# Altium footprint library Connectors.PcbLib: 268 footprints (part 18 of 21)
Each footprint in its own frame and in the unit in brackets; x right, y up, seen from the top. Pads: shape width x height; smd on the part's side, far side on the other; paste and mask are expansions set on the pad; w line width, h text height; cw(c..) or ccw(c..) is an arc to the next point about the centre after c.
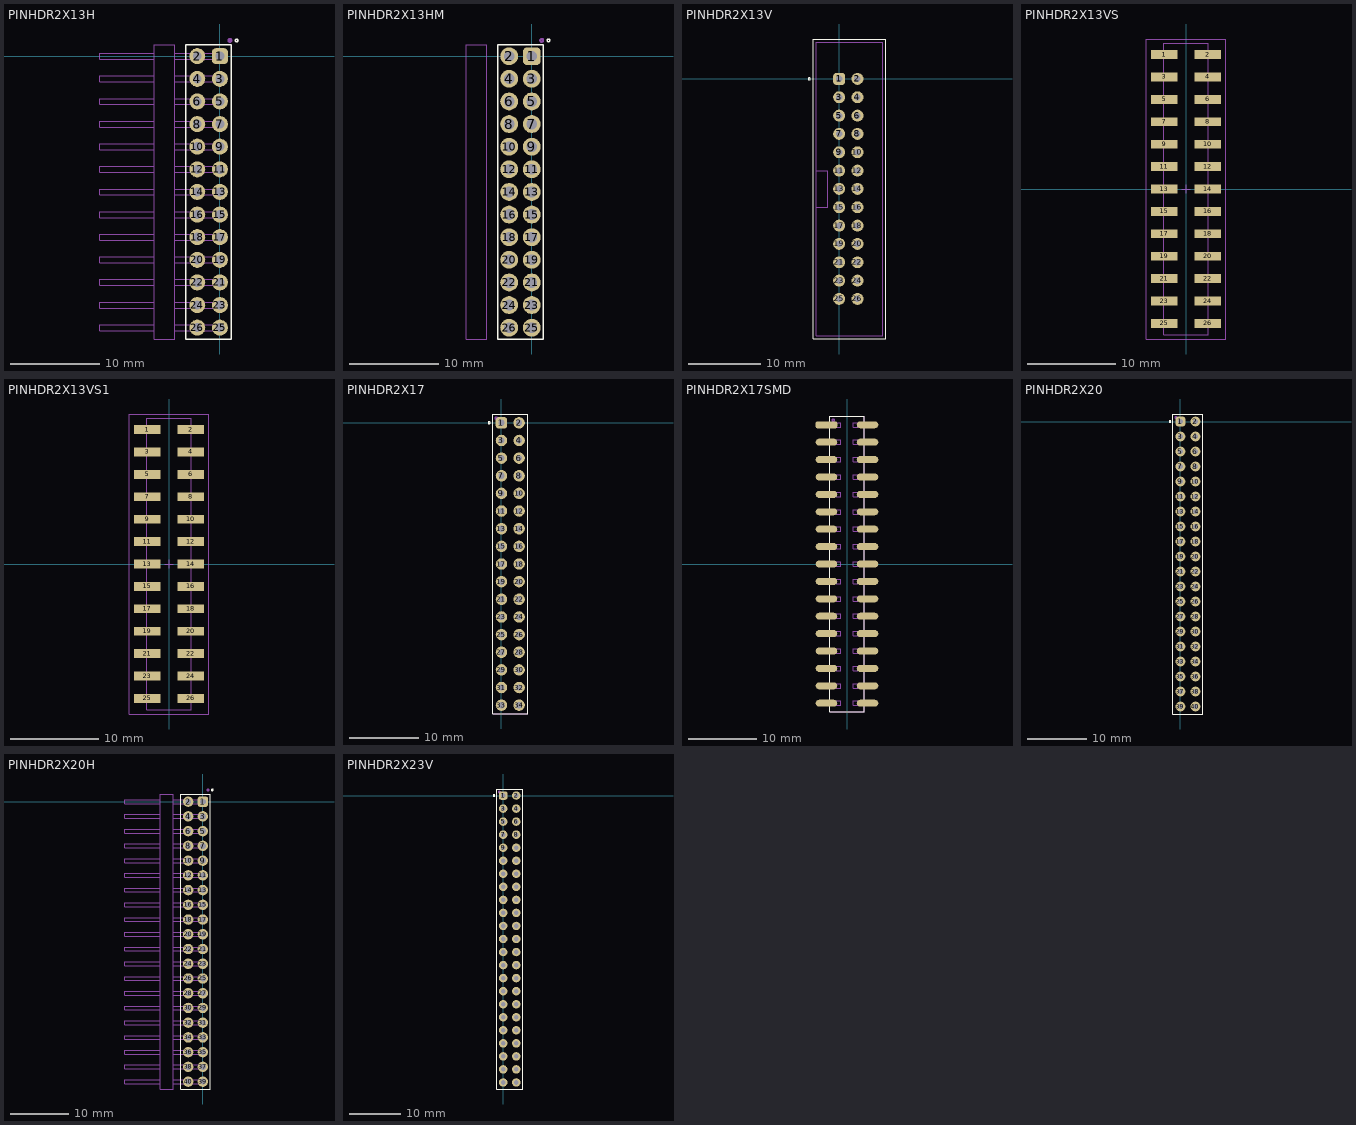
[diagram p17: the footprints below, top view; thin cyan lines are the x and y axes]

## PINHDR2X13H [mm] "Pin header 2x13 pin R2.54mm Horizontal"
height 8.16
pads (26):
  rrect50% 1.8x1.8 hole 1 paste-1.27: 1(0,0)
  round 1.8 hole 1 paste-1.27: 2(-2.54,0) 3(0,-2.54) 4(-2.54,-2.54) 5(0,-5.08) 6(-2.54,-5.08) 7(0,-7.62) 8(-2.54,-7.62) 9(0,-10.16) 10(-2.54,-10.16) 11(0,-12.7) 12(-2.54,-12.7) 13(0,-15.24) 14(-2.54,-15.24) 15(0,-17.78) 16(-2.54,-17.78) 17(0,-20.32) 18(-2.54,-20.32) 19(0,-22.86) 20(-2.54,-22.86) 21(0,-25.4) 22(-2.54,-25.4) 23(0,-27.94) 24(-2.54,-27.94) 25(0,-30.48) 26(-2.54,-30.48)
Top Overlay:
  circle w0.15: c1.88,1.778 r0.152
  lines w0.15: -3.81,-31.75 -3.81,1.27 1.27,1.27 1.27,-31.75 -3.81,-31.75
Mechanical 13:
  circle w0.254: c1.118,1.778 r0.152
  lines w0.1: -7.37,-30.81 -13.462,-30.81 -13.462,-30.15 -7.37,-30.15 ; -7.37,-28.27 -13.462,-28.27 -13.462,-27.61 -7.37,-27.61 ; -7.37,-25.73 -13.462,-25.73 -13.462,-25.07 -7.37,-25.07 ; -7.37,-23.19 -13.462,-23.19 -13.462,-22.53 -7.37,-22.53 ; -7.37,-20.65 -13.462,-20.65 -13.462,-19.99 -7.37,-19.99 ; -7.37,-18.11 -13.462,-18.11 -13.462,-17.45 -7.37,-17.45 ; -7.37,-15.57 -13.462,-15.57 -13.462,-14.91 -7.37,-14.91 ; -7.37,-13.03 -13.462,-13.03 -13.462,-12.37 -7.37,-12.37 ; -7.37,-10.49 -13.462,-10.49 -13.462,-9.83 -7.37,-9.83 ; -7.37,-7.95 -13.462,-7.95 -13.462,-7.29 -7.37,-7.29 ; -7.37,-5.41 -13.462,-5.41 -13.462,-4.75 -7.37,-4.75 ; -7.37,-2.87 -13.462,-2.87 -13.462,-2.21 -7.37,-2.21 ; -7.37,-0.33 -13.462,-0.33 -13.462,0.33 -7.37,0.33 ; -5.08,-30.81 0.33,-30.81 0.33,-30.15 -5.08,-30.15 ; -5.08,-28.27 0.33,-28.27 0.33,-27.61 -5.08,-27.61 ; -5.08,-25.73 0.33,-25.73 0.33,-25.07 -5.08,-25.07 ; -5.08,-23.19 0.33,-23.19 0.33,-22.53 -5.08,-22.53 ; -5.08,-20.65 0.33,-20.65 0.33,-19.99 -5.08,-19.99 ; -5.08,-18.11 0.33,-18.11 0.33,-17.45 -5.08,-17.45 ; -5.08,-15.57 0.33,-15.57 0.33,-14.91 -5.08,-14.91 ; -5.08,-13.03 0.33,-13.03 0.33,-12.37 -5.08,-12.37 ; -5.08,-10.49 0.33,-10.49 0.33,-9.83 -5.08,-9.83 ; -5.08,-7.95 0.33,-7.95 0.33,-7.29 -5.08,-7.29 ; -5.08,-5.41 0.33,-5.41 0.33,-4.75 -5.08,-4.75 ; -5.08,-2.87 0.33,-2.87 0.33,-2.21 -5.08,-2.21 ; -5.08,-0.33 0.33,-0.33 0.33,0.33 -5.08,0.33
  lines w0.102: -7.37,-31.75 -7.37,1.27 -5.08,1.27 -5.08,-31.75 -7.37,-31.75
3D body: height 1.9, standoff 1.25, extent -13.462,-0.33 -7.37,0.33
3D body: height 1.9, standoff 1.25, extent -13.462,-2.87 -7.37,-2.21
3D body: height 1.9, standoff 1.25, extent -13.462,-5.41 -7.37,-4.75
3D body: height 1.9, standoff 1.25, extent -13.462,-7.95 -7.37,-7.29
3D body: height 1.9, standoff 1.25, extent -13.462,-10.49 -7.37,-9.83
3D body: height 1.9, standoff 1.25, extent -13.462,-13.03 -7.37,-12.37
3D body: height 1.9, standoff 1.25, extent -13.462,-15.57 -7.37,-14.91
3D body: height 1.9, standoff 1.25, extent -13.462,-18.11 -7.37,-17.45
3D body: height 1.9, standoff 1.25, extent -13.462,-20.65 -7.37,-19.99
3D body: height 1.9, standoff 1.25, extent -13.462,-23.19 -7.37,-22.53
3D body: height 1.9, standoff 1.25, extent -13.462,-25.73 -7.37,-25.07
3D body: height 1.9, standoff 1.25, extent -13.462,-28.27 -7.37,-27.61
3D body: height 1.9, standoff 1.25, extent -13.462,-30.81 -7.37,-30.15
3D body: height 4.43, standoff 3.75, extent -13.462,-0.33 -7.37,0.33
3D body: height 4.43, standoff 3.75, extent -13.462,-2.87 -7.37,-2.21
3D body: height 4.43, standoff 3.75, extent -13.462,-5.41 -7.37,-4.75
3D body: height 4.43, standoff 3.75, extent -13.462,-7.95 -7.37,-7.29
3D body: height 4.43, standoff 3.75, extent -13.462,-10.49 -7.37,-9.83
3D body: height 4.43, standoff 3.75, extent -13.462,-13.03 -7.37,-12.37
3D body: height 4.43, standoff 3.75, extent -13.462,-15.57 -7.37,-14.91
3D body: height 4.43, standoff 3.75, extent -13.462,-18.11 -7.37,-17.45
3D body: height 4.43, standoff 3.75, extent -13.462,-20.65 -7.37,-19.99
3D body: height 4.43, standoff 3.75, extent -13.462,-23.19 -7.37,-22.53
3D body: height 4.43, standoff 3.75, extent -13.462,-25.73 -7.37,-25.07
3D body: height 4.43, standoff 3.75, extent -13.462,-28.27 -7.37,-27.61
3D body: height 4.43, standoff 3.75, extent -13.462,-30.81 -7.37,-30.15
3D body: height 4.43, standoff 3.75, extent -5.08,-0.33 0.33,0.33
3D body: height 4.43, standoff 3.75, extent -5.08,-2.87 0.33,-2.21
3D body: height 4.43, standoff 3.75, extent -5.08,-5.41 0.33,-4.75
3D body: height 4.43, standoff 3.75, extent -5.08,-7.95 0.33,-7.29
3D body: height 4.43, standoff 3.75, extent -5.08,-10.49 0.33,-9.83
3D body: height 4.43, standoff 3.75, extent -5.08,-13.03 0.33,-12.37
3D body: height 4.43, standoff 3.75, extent -5.08,-15.57 0.33,-14.91
3D body: height 4.43, standoff 3.75, extent -5.08,-18.11 0.33,-17.45
3D body: height 4.43, standoff 3.75, extent -5.08,-20.65 0.33,-19.99
3D body: height 4.43, standoff 3.75, extent -5.08,-23.19 0.33,-22.53
3D body: height 4.43, standoff 3.75, extent -5.08,-25.73 0.33,-25.07
3D body: height 4.43, standoff 3.75, extent -5.08,-28.27 0.33,-27.61
3D body: height 4.43, standoff 3.75, extent -5.08,-30.81 0.33,-30.15
3D body: height 1.9, standoff 1.25, extent -5.08,-0.33 -2.21,0.33
3D body: height 1.9, standoff 1.25, extent -5.08,-2.87 -2.21,-2.21
3D body: height 1.9, standoff 1.25, extent -5.08,-5.41 -2.21,-4.75
3D body: height 1.9, standoff 1.25, extent -5.08,-7.95 -2.21,-7.29
3D body: height 1.9, standoff 1.25, extent -5.08,-10.49 -2.21,-9.83
3D body: height 1.9, standoff 1.25, extent -5.08,-13.03 -2.21,-12.37
3D body: height 1.9, standoff 1.25, extent -5.08,-15.57 -2.21,-14.91
3D body: height 1.9, standoff 1.25, extent -5.08,-18.11 -2.21,-17.45
3D body: height 1.9, standoff 1.25, extent -5.08,-20.65 -2.21,-19.99
3D body: height 1.9, standoff 1.25, extent -5.08,-23.19 -2.21,-22.53
3D body: height 1.9, standoff 1.25, extent -5.08,-25.73 -2.21,-25.07
3D body: height 1.9, standoff 1.25, extent -5.08,-28.27 -2.21,-27.61
3D body: height 1.9, standoff 1.25, extent -5.08,-30.81 -2.21,-30.15
3D body: height 5, standoff 0, extent -7.37,-31.75 -5.08,1.27
3D body: height 1.25, standoff 0, extent -2.87,-30.81 -2.21,-30.15
3D body: height 1.25, standoff 0, extent -2.87,-28.27 -2.21,-27.61
3D body: height 1.25, standoff 0, extent -2.87,-25.73 -2.21,-25.07
3D body: height 1.25, standoff 0, extent -2.87,-23.19 -2.21,-22.53
3D body: height 1.25, standoff 0, extent -2.87,-20.65 -2.21,-19.99
3D body: height 1.25, standoff 0, extent -2.87,-18.11 -2.21,-17.45
3D body: height 1.25, standoff 0, extent -2.87,-15.57 -2.21,-14.91
3D body: height 1.25, standoff 0, extent -2.87,-13.03 -2.21,-12.37
3D body: height 1.25, standoff 0, extent -2.87,-10.49 -2.21,-9.83
3D body: height 1.25, standoff 0, extent -2.87,-7.95 -2.21,-7.29
3D body: height 1.25, standoff 0, extent -2.87,-5.41 -2.21,-4.75
3D body: height 1.25, standoff 0, extent -2.87,-2.87 -2.21,-2.21
3D body: height 1.25, standoff 0, extent -2.87,-0.33 -2.21,0.33
3D body: height 3.75, standoff 0, extent -0.33,-30.81 0.33,-30.15
3D body: height 3.75, standoff 0, extent -0.33,-28.27 0.33,-27.61
3D body: height 3.75, standoff 0, extent -0.33,-25.73 0.33,-25.07
3D body: height 3.75, standoff 0, extent -0.33,-23.19 0.33,-22.53
3D body: height 3.75, standoff 0, extent -0.33,-20.65 0.33,-19.99
3D body: height 3.75, standoff 0, extent -0.33,-18.11 0.33,-17.45
3D body: height 3.75, standoff 0, extent -0.33,-15.57 0.33,-14.91
3D body: height 3.75, standoff 0, extent -0.33,-13.03 0.33,-12.37
3D body: height 3.75, standoff 0, extent -0.33,-10.49 0.33,-9.83
3D body: height 3.75, standoff 0, extent -0.33,-7.95 0.33,-7.29
3D body: height 3.75, standoff 0, extent -0.33,-5.41 0.33,-4.75
3D body: height 3.75, standoff 0, extent -0.33,-2.87 0.33,-2.21
3D body: height 3.75, standoff 0, extent -0.33,-0.33 0.33,0.33

## PINHDR2X13HM [mm] "Pin header 2x13 pin R2.54mm Horizontal"
height 8.16
pads (26):
  rrect50% 2x2 hole 1.2 paste-1.27: 1(0,0)
  round 2 hole 1.2 paste-1.27: 2(-2.54,0) 3(0,-2.54) 4(-2.54,-2.54) 5(0,-5.08) 6(-2.54,-5.08) 7(0,-7.62) 8(-2.54,-7.62) 9(0,-10.16) 10(-2.54,-10.16) 11(0,-12.7) 12(-2.54,-12.7) 13(0,-15.24) 14(-2.54,-15.24) 15(0,-17.78) 16(-2.54,-17.78) 17(0,-20.32) 18(-2.54,-20.32) 19(0,-22.86) 20(-2.54,-22.86) 21(0,-25.4) 22(-2.54,-25.4) 23(0,-27.94) 24(-2.54,-27.94) 25(0,-30.48) 26(-2.54,-30.48)
Top Overlay:
  circle w0.15: c1.88,1.778 r0.152
  lines w0.15: -3.81,-31.75 -3.81,1.27 1.27,1.27 1.27,-31.75 -3.81,-31.75
Mechanical 13:
  circle w0.254: c1.118,1.778 r0.152
  lines w0.102: -7.37,-31.75 -7.37,1.27 -5.08,1.27 -5.08,-31.75 -7.37,-31.75
3D body: height 1.9, standoff 1.25, extent -13.462,-0.33 -7.37,0.33
3D body: height 1.9, standoff 1.25, extent -13.462,-2.87 -7.37,-2.21
3D body: height 1.9, standoff 1.25, extent -13.462,-5.41 -7.37,-4.75
3D body: height 1.9, standoff 1.25, extent -13.462,-7.95 -7.37,-7.29
3D body: height 1.9, standoff 1.25, extent -13.462,-10.49 -7.37,-9.83
3D body: height 1.9, standoff 1.25, extent -13.462,-13.03 -7.37,-12.37
3D body: height 1.9, standoff 1.25, extent -13.462,-15.57 -7.37,-14.91
3D body: height 1.9, standoff 1.25, extent -13.462,-18.11 -7.37,-17.45
3D body: height 1.9, standoff 1.25, extent -13.462,-20.65 -7.37,-19.99
3D body: height 1.9, standoff 1.25, extent -13.462,-23.19 -7.37,-22.53
3D body: height 1.9, standoff 1.25, extent -13.462,-25.73 -7.37,-25.07
3D body: height 1.9, standoff 1.25, extent -13.462,-28.27 -7.37,-27.61
3D body: height 1.9, standoff 1.25, extent -13.462,-30.81 -7.37,-30.15
3D body: height 4.43, standoff 3.75, extent -13.462,-0.33 -7.37,0.33
3D body: height 4.43, standoff 3.75, extent -13.462,-2.87 -7.37,-2.21
3D body: height 4.43, standoff 3.75, extent -13.462,-5.41 -7.37,-4.75
3D body: height 4.43, standoff 3.75, extent -13.462,-7.95 -7.37,-7.29
3D body: height 4.43, standoff 3.75, extent -13.462,-10.49 -7.37,-9.83
3D body: height 4.43, standoff 3.75, extent -13.462,-13.03 -7.37,-12.37
3D body: height 4.43, standoff 3.75, extent -13.462,-15.57 -7.37,-14.91
3D body: height 4.43, standoff 3.75, extent -13.462,-18.11 -7.37,-17.45
3D body: height 4.43, standoff 3.75, extent -13.462,-20.65 -7.37,-19.99
3D body: height 4.43, standoff 3.75, extent -13.462,-23.19 -7.37,-22.53
3D body: height 4.43, standoff 3.75, extent -13.462,-25.73 -7.37,-25.07
3D body: height 4.43, standoff 3.75, extent -13.462,-28.27 -7.37,-27.61
3D body: height 4.43, standoff 3.75, extent -13.462,-30.81 -7.37,-30.15
3D body: height 4.43, standoff 3.75, extent -5.08,-0.33 0.33,0.33
3D body: height 4.43, standoff 3.75, extent -5.08,-2.87 0.33,-2.21
3D body: height 4.43, standoff 3.75, extent -5.08,-5.41 0.33,-4.75
3D body: height 4.43, standoff 3.75, extent -5.08,-7.95 0.33,-7.29
3D body: height 4.43, standoff 3.75, extent -5.08,-10.49 0.33,-9.83
3D body: height 4.43, standoff 3.75, extent -5.08,-13.03 0.33,-12.37
3D body: height 4.43, standoff 3.75, extent -5.08,-15.57 0.33,-14.91
3D body: height 4.43, standoff 3.75, extent -5.08,-18.11 0.33,-17.45
3D body: height 4.43, standoff 3.75, extent -5.08,-20.65 0.33,-19.99
3D body: height 4.43, standoff 3.75, extent -5.08,-23.19 0.33,-22.53
3D body: height 4.43, standoff 3.75, extent -5.08,-25.73 0.33,-25.07
3D body: height 4.43, standoff 3.75, extent -5.08,-28.27 0.33,-27.61
3D body: height 4.43, standoff 3.75, extent -5.08,-30.81 0.33,-30.15
3D body: height 1.9, standoff 1.25, extent -5.08,-0.33 -2.21,0.33
3D body: height 1.9, standoff 1.25, extent -5.08,-2.87 -2.21,-2.21
3D body: height 1.9, standoff 1.25, extent -5.08,-5.41 -2.21,-4.75
3D body: height 1.9, standoff 1.25, extent -5.08,-7.95 -2.21,-7.29
3D body: height 1.9, standoff 1.25, extent -5.08,-10.49 -2.21,-9.83
3D body: height 1.9, standoff 1.25, extent -5.08,-13.03 -2.21,-12.37
3D body: height 1.9, standoff 1.25, extent -5.08,-15.57 -2.21,-14.91
3D body: height 1.9, standoff 1.25, extent -5.08,-18.11 -2.21,-17.45
3D body: height 1.9, standoff 1.25, extent -5.08,-20.65 -2.21,-19.99
3D body: height 1.9, standoff 1.25, extent -5.08,-23.19 -2.21,-22.53
3D body: height 1.9, standoff 1.25, extent -5.08,-25.73 -2.21,-25.07
3D body: height 1.9, standoff 1.25, extent -5.08,-28.27 -2.21,-27.61
3D body: height 1.9, standoff 1.25, extent -5.08,-30.81 -2.21,-30.15
3D body: height 5, standoff 0, extent -7.37,-31.75 -5.08,1.27
3D body: height 1.25, standoff 0, extent -2.87,-30.81 -2.21,-30.15
3D body: height 1.25, standoff 0, extent -2.87,-28.27 -2.21,-27.61
3D body: height 1.25, standoff 0, extent -2.87,-25.73 -2.21,-25.07
3D body: height 1.25, standoff 0, extent -2.87,-23.19 -2.21,-22.53
3D body: height 1.25, standoff 0, extent -2.87,-20.65 -2.21,-19.99
3D body: height 1.25, standoff 0, extent -2.87,-18.11 -2.21,-17.45
3D body: height 1.25, standoff 0, extent -2.87,-15.57 -2.21,-14.91
3D body: height 1.25, standoff 0, extent -2.87,-13.03 -2.21,-12.37
3D body: height 1.25, standoff 0, extent -2.87,-10.49 -2.21,-9.83
3D body: height 1.25, standoff 0, extent -2.87,-7.95 -2.21,-7.29
3D body: height 1.25, standoff 0, extent -2.87,-5.41 -2.21,-4.75
3D body: height 1.25, standoff 0, extent -2.87,-2.87 -2.21,-2.21
3D body: height 1.25, standoff 0, extent -2.87,-0.33 -2.21,0.33
3D body: height 3.75, standoff 0, extent -0.33,-30.81 0.33,-30.15
3D body: height 3.75, standoff 0, extent -0.33,-28.27 0.33,-27.61
3D body: height 3.75, standoff 0, extent -0.33,-25.73 0.33,-25.07
3D body: height 3.75, standoff 0, extent -0.33,-23.19 0.33,-22.53
3D body: height 3.75, standoff 0, extent -0.33,-20.65 0.33,-19.99
3D body: height 3.75, standoff 0, extent -0.33,-18.11 0.33,-17.45
3D body: height 3.75, standoff 0, extent -0.33,-15.57 0.33,-14.91
3D body: height 3.75, standoff 0, extent -0.33,-13.03 0.33,-12.37
3D body: height 3.75, standoff 0, extent -0.33,-10.49 0.33,-9.83
3D body: height 3.75, standoff 0, extent -0.33,-7.95 0.33,-7.29
3D body: height 3.75, standoff 0, extent -0.33,-5.41 0.33,-4.75
3D body: height 3.75, standoff 0, extent -0.33,-2.87 0.33,-2.21
3D body: height 3.75, standoff 0, extent -0.33,-0.33 0.33,0.33

## PINHDR2X13V [mil] "Pin header 2x13 pin R2.54mm"
height 354.33
pads (26):
  rrect50% 65x65 hole 35.43 paste-50: 1(0,0)
  round 65 hole 35.43 paste-50: 2(100,0) 3(0,-100) 4(100,-100) 5(0,-200) 6(100,-200) 7(0,-300) 8(100,-300) 9(0,-400) 10(100,-400) 11(0,-500) 12(100,-500) 13(0,-600) 14(100,-600) 15(0,-700) 16(100,-700) 17(0,-800) 18(100,-800) 19(0,-900) 20(100,-900) 21(0,-1000) 22(100,-1000) 23(0,-1100) 24(100,-1100) 25(0,-1200) 26(100,-1200)
Top Overlay:
  circle w5.91: c-163.39,0 r6
  lines w5.91: -141.73,-1418.31 -141.73,217.52 254.92,217.52 254.92,-1418.31 -141.73,-1418.31
Mechanical 13:
  lines w3.94: -125,-700.79 -62.99,-700.79 -62.99,-500 -125,-500 ; -125,-1400.2 238,-1400.2 238,199.8 -125,199.8 -125,-1400.2
3D body "c-1761681-09-a-3d.stp": height 350.48, standoff -126.52, extent -125,-1400.2 238,199.8

## PINHDR2X13VS [mm] "Pin header 2x13 pin R2.54mm"
height 11.04
pads (26):
  rect 3x1 smd: 1(-2.44,15.24) 2(2.44,15.24) 3(-2.44,12.7) 4(2.44,12.7) 5(-2.44,10.16) 6(2.44,10.16) 7(-2.44,7.62) 8(2.44,7.62) 9(-2.44,5.08) 10(2.44,5.08) 11(-2.44,2.54) 12(2.44,2.54) 13(-2.44,0) 14(2.44,0) 15(-2.44,-2.54) 16(2.44,-2.54) 17(-2.44,-5.08) 18(2.44,-5.08) 19(-2.44,-7.62) 20(2.44,-7.62) 21(-2.44,-10.16) 22(2.44,-10.16) 23(-2.44,-12.7) 24(2.44,-12.7) 25(-2.44,-15.24) 26(2.44,-15.24)
Mechanical 13:
  lines w0.102: -2.54,-16.51 -2.54,16.51 2.54,16.51 2.54,-16.51 -2.54,-16.51
  text "1" at -1.93,14.681 h2.03
  text "2" at 0.94,14.681 h2.03
  text "25" at -2.134,-15.9 h2.03
  text "26" at 0.254,-15.85 h2.03
Mechanical 15:
  lines w0.102: -0.5,0 0.5,0 ; 0,-0.5 0,0.5 ; -4.5,-17 4.5,-17 4.5,17 -4.5,17 -4.5,-17
3D body: height 11.04, standoff 0, extent 0.838,14.834 1.651,15.646
3D body: height 11.04, standoff 0, extent -1.651,14.834 -0.838,15.646
3D body: height 4.04, standoff 1.5, extent -2.54,-16.51 2.54,16.51
3D body: height 11.04, standoff 0, extent -1.651,14.834 -0.838,15.646
3D body: height 11.04, standoff 0, extent 0.838,14.834 1.651,15.646
3D body: height 11.04, standoff 0, extent -1.651,12.294 -0.838,13.106
3D body: height 11.04, standoff 0, extent 0.838,12.294 1.651,13.106
3D body: height 11.04, standoff 0, extent -1.651,9.754 -0.838,10.566
3D body: height 11.04, standoff 0, extent 0.838,9.754 1.651,10.566
3D body: height 11.04, standoff 0, extent -1.651,7.214 -0.838,8.026
3D body: height 11.04, standoff 0, extent 0.838,7.214 1.651,8.026
3D body: height 11.04, standoff 0, extent -1.651,4.674 -0.838,5.486
3D body: height 11.04, standoff 0, extent 0.838,4.674 1.651,5.486
3D body: height 11.04, standoff 0, extent -1.651,2.134 -0.838,2.946
3D body: height 11.04, standoff 0, extent 0.838,2.134 1.651,2.946
3D body: height 11.04, standoff 0, extent -1.651,-0.406 -0.838,0.406
3D body: height 11.04, standoff 0, extent 0.838,-0.406 1.651,0.406
3D body: height 11.04, standoff 0, extent -1.651,-2.946 -0.838,-2.134
3D body: height 11.04, standoff 0, extent 0.838,-2.946 1.651,-2.134
3D body: height 11.04, standoff 0, extent -1.651,-5.486 -0.838,-4.674
3D body: height 11.04, standoff 0, extent 0.838,-5.486 1.651,-4.674
3D body: height 11.04, standoff 0, extent -1.651,-8.026 -0.838,-7.214
3D body: height 11.04, standoff 0, extent 0.838,-8.026 1.651,-7.214
3D body: height 11.04, standoff 0, extent -1.651,-10.566 -0.838,-9.754
3D body: height 11.04, standoff 0, extent 0.838,-10.566 1.651,-9.754
3D body: height 11.04, standoff 0, extent -1.651,-13.106 -0.838,-12.294
3D body: height 11.04, standoff 0, extent 0.838,-13.106 1.651,-12.294
3D body: height 11.04, standoff 0, extent -1.651,-15.646 -0.838,-14.834
3D body: height 11.04, standoff 0, extent 0.838,-15.646 1.651,-14.834

## PINHDR2X13VS1 [mm] "Pin header 2x13 pin R2.54mm"
height 14.62
pads (26):
  rect 3x1 smd: 1(-2.44,15.24) 2(2.44,15.24) 3(-2.44,12.7) 4(2.44,12.7) 5(-2.44,10.16) 6(2.44,10.16) 7(-2.44,7.62) 8(2.44,7.62) 9(-2.44,5.08) 10(2.44,5.08) 11(-2.44,2.54) 12(2.44,2.54) 13(-2.44,0) 14(2.44,0) 15(-2.44,-2.54) 16(2.44,-2.54) 17(-2.44,-5.08) 18(2.44,-5.08) 19(-2.44,-7.62) 20(2.44,-7.62) 21(-2.44,-10.16) 22(2.44,-10.16) 23(-2.44,-12.7) 24(2.44,-12.7) 25(-2.44,-15.24) 26(2.44,-15.24)
Mechanical 13:
  lines w0.102: -2.54,-16.51 2.54,-16.51 2.54,16.51 -2.54,16.51 -2.54,-16.51
  text "26" at 0.254,-15.85 h2.03
  text "25" at -2.134,-15.9 h2.03
  text "2" at 0.94,14.681 h2.03
  text "1" at -1.93,14.681 h2.03
Mechanical 15:
  lines w0.102: -0.5,0 0.5,0 ; 0,-0.5 0,0.5 ; -4.5,-17 -4.5,17 4.5,17 4.5,-17 -4.5,-17
3D body: height 14.62, standoff 0, extent 0.838,-15.646 1.651,-14.834
3D body: height 14.62, standoff 0, extent -1.651,-15.646 -0.838,-14.834
3D body: height 14.62, standoff 0, extent 0.838,-13.106 1.651,-12.294
3D body: height 14.62, standoff 0, extent -1.651,-13.106 -0.838,-12.294
3D body: height 14.62, standoff 0, extent 0.838,-10.566 1.651,-9.754
3D body: height 14.62, standoff 0, extent -1.651,-10.566 -0.838,-9.754
3D body: height 14.62, standoff 0, extent 0.838,-8.026 1.651,-7.214
3D body: height 14.62, standoff 0, extent -1.651,-8.026 -0.838,-7.214
3D body: height 14.62, standoff 0, extent 0.838,-5.486 1.651,-4.674
3D body: height 14.62, standoff 0, extent -1.651,-5.486 -0.838,-4.674
3D body: height 14.62, standoff 0, extent 0.838,-2.946 1.651,-2.134
3D body: height 14.62, standoff 0, extent -1.651,-2.946 -0.838,-2.134
3D body: height 14.62, standoff 0, extent 0.838,-0.406 1.651,0.406
3D body: height 14.62, standoff 0, extent -1.651,-0.406 -0.838,0.406
3D body: height 14.62, standoff 0, extent 0.838,2.134 1.651,2.946
3D body: height 14.62, standoff 0, extent -1.651,2.134 -0.838,2.946
3D body: height 14.62, standoff 0, extent 0.838,4.674 1.651,5.486
3D body: height 14.62, standoff 0, extent -1.651,4.674 -0.838,5.486
3D body: height 14.62, standoff 0, extent 0.838,7.214 1.651,8.026
3D body: height 14.62, standoff 0, extent -1.651,7.214 -0.838,8.026
3D body: height 14.62, standoff 0, extent 0.838,9.754 1.651,10.566
3D body: height 14.62, standoff 0, extent -1.651,9.754 -0.838,10.566
3D body: height 14.62, standoff 0, extent 0.838,12.294 1.651,13.106
3D body: height 14.62, standoff 0, extent -1.651,12.294 -0.838,13.106
3D body: height 14.62, standoff 0, extent 0.838,14.834 1.651,15.646
3D body: height 14.62, standoff 0, extent -1.651,14.834 -0.838,15.646
3D body: height 4.04, standoff 1.5, extent -2.54,-16.51 2.54,16.51
3D body: height 14.62, standoff 0, extent -1.651,14.834 -0.838,15.646
3D body: height 14.62, standoff 0, extent 0.838,14.834 1.651,15.646

## PINHDR2X17 [mil] "Pin header 2x17 pin R2.54mm"
height 433.07
pads (34):
  rrect50% 65x65 hole 35.43 paste-50: 1(0,0)
  round 65 hole 35.43 paste-50: 2(100,0) 3(0,-100) 4(100,-100) 5(0,-200) 6(100,-200) 7(0,-300) 8(100,-300) 9(0,-400) 10(100,-400) 11(0,-500) 12(100,-500) 13(0,-600) 14(100,-600) 15(0,-700) 16(100,-700) 17(0,-800) 18(100,-800) 19(0,-900) 20(100,-900) 21(0,-1000) 22(100,-1000) 23(0,-1100) 24(100,-1100) 25(0,-1200) 26(100,-1200) 27(0,-1300) 28(100,-1300) 29(0,-1400) 30(100,-1400) 31(0,-1500) 32(100,-1500) 33(0,-1600) 34(100,-1600)
Top Overlay:
  circle w5.91: c-70,0 r6
  lines w5.91: -50,-1650 -50,50 150,50 150,-1650 -50,-1650
Mechanical 13:
  circle w10: c-29,26 r6
  lines w4: -50,-1650 -50,50 150,50 150,-1650 -50,-1650
3D body: height 314.96, standoff -125.98, extent -13,-13 13,13
3D body: height 314.96, standoff -125.98, extent 87,-13 113,13
3D body: height 100, standoff 0, extent -50,-1650 150,50
3D body: height 314.96, standoff -125.98, extent 87,-113 113,-87
3D body: height 314.96, standoff -125.98, extent -13,-113 13,-87
3D body: height 314.96, standoff -125.98, extent 87,-213 113,-187
3D body: height 314.96, standoff -125.98, extent -13,-213 13,-187
3D body: height 314.96, standoff -125.98, extent 87,-313 113,-287
3D body: height 314.96, standoff -125.98, extent -13,-313 13,-287
3D body: height 314.96, standoff -125.98, extent 87,-413 113,-387
3D body: height 314.96, standoff -125.98, extent -13,-413 13,-387
3D body: height 314.96, standoff -125.98, extent 87,-513 113,-487
3D body: height 314.96, standoff -125.98, extent -13,-513 13,-487
3D body: height 314.96, standoff -125.98, extent 87,-613 113,-587
3D body: height 314.96, standoff -125.98, extent -13,-613 13,-587
3D body: height 314.96, standoff -125.98, extent 87,-713 113,-687
3D body: height 314.96, standoff -125.98, extent -13,-713 13,-687
3D body: height 314.96, standoff -125.98, extent 87,-813 113,-787
3D body: height 314.96, standoff -125.98, extent -13,-813 13,-787
3D body: height 314.96, standoff -125.98, extent 87,-913 113,-887
3D body: height 314.96, standoff -125.98, extent -13,-913 13,-887
3D body: height 314.96, standoff -125.98, extent 87,-1013 113,-987
3D body: height 314.96, standoff -125.98, extent -13,-1013 13,-987
3D body: height 314.96, standoff -125.98, extent 87,-1113 113,-1087
3D body: height 314.96, standoff -125.98, extent -13,-1113 13,-1087
3D body: height 314.96, standoff -125.98, extent 87,-1213 113,-1187
3D body: height 314.96, standoff -125.98, extent -13,-1213 13,-1187
3D body: height 314.96, standoff -125.98, extent 87,-1313 113,-1287
3D body: height 314.96, standoff -125.98, extent -13,-1313 13,-1287
3D body: height 314.96, standoff -125.98, extent 87,-1413 113,-1387
3D body: height 314.96, standoff -125.98, extent -13,-1413 13,-1387
3D body: height 314.96, standoff -125.98, extent 87,-1513 113,-1487
3D body: height 314.96, standoff -125.98, extent -13,-1513 13,-1487
3D body: height 314.96, standoff -125.98, extent 87,-1613 113,-1587
3D body: height 314.96, standoff -125.98, extent -13,-1613 13,-1587

## PINHDR2X17SMD [mil] "Pin header 2x17 pin R2.54mm SMD"
height 433.07
pads (34):
  rrect50% 124x40 smd: 1(-118,800)
  oval 124x40 smd: 2(118,800) 3(-118,700) 4(118,700) 5(-118,600) 6(118,600) 7(-118,500) 8(118,500) 9(-118,400) 10(118,400) 11(-118,300) 12(118,300) 13(-118,200) 14(118,200) 15(-118,100) 16(118,100) 17(-118,0) 18(118,0) 19(-118,-100) 20(118,-100) 21(-118,-200) 22(118,-200) 23(-118,-300) 24(118,-300) 25(-118,-400) 26(118,-400) 27(-118,-500) 28(118,-500) 29(-118,-600) 30(118,-600) 31(-118,-700) 32(118,-700) 33(-118,-800) 34(118,-800)
Top Overlay:
  lines w5.91: -100,-850 100,-850 100,850 -100,850 -100,-850
Mechanical 13:
  circle w10: c-79,826 r6
  lines w3.94: -63,-813 -37,-813 -37,-787 -63,-787 -63,-813 ; -63,-713 -63,-687 -37,-687 -37,-713 -63,-713 ; -63,-613 -37,-613 -37,-587 -63,-587 -63,-613 ; -63,-513 -63,-487 -37,-487 -37,-513 -63,-513 ; -63,-413 -37,-413 -37,-387 -63,-387 -63,-413 ; -63,-313 -63,-287 -37,-287 -37,-313 -63,-313 ; -63,-213 -37,-213 -37,-187 -63,-187 -63,-213 ; -63,-113 -63,-87 -37,-87 -37,-113 -63,-113 ; -63,-13 -37,-13 -37,13 -63,13 -63,-13 ; -63,87 -63,113 -37,113 -37,87 -63,87 ; -63,187 -37,187 -37,213 -63,213 -63,187 ; -63,287 -63,313 -37,313 -37,287 -63,287 ; -63,387 -37,387 -37,413 -63,413 -63,387 ; -63,487 -63,513 -37,513 -37,487 -63,487 ; -63,587 -37,587 -37,613 -63,613 -63,587 ; -63,687 -37,687 -37,713 -63,713 -63,687 ; -63,787 -63,813 -37,813 -37,787 -63,787 ; 37,-813 37,-787 63,-787 63,-813 37,-813 ; 37,-713 63,-713 63,-687 37,-687 37,-713 ; 37,-613 37,-587 63,-587 63,-613 37,-613 ; 37,-513 63,-513 63,-487 37,-487 37,-513 ; 37,-413 37,-387 63,-387 63,-413 37,-413 ; 37,-313 63,-313 63,-287 37,-287 37,-313 ; 37,-213 37,-187 63,-187 63,-213 37,-213 ; 37,-113 63,-113 63,-87 37,-87 37,-113 ; 37,-13 37,13 63,13 63,-13 37,-13 ; 37,87 63,87 63,113 37,113 37,87 ; 37,187 37,213 63,213 63,187 37,187 ; 37,287 63,287 63,313 37,313 37,287 ; 37,387 37,413 63,413 63,387 37,387 ; 37,487 63,487 63,513 37,513 37,487 ; 37,587 37,613 63,613 63,587 37,587 ; 37,687 37,713 63,713 63,687 37,687 ; 37,787 63,787 63,813 37,813 37,787
  lines w4: -100,-850 100,-850 100,850 -100,850 -100,-850
3D body: height 100, standoff 0, extent -100,-850 100,850
3D body: height 393.7, standoff 0, extent -63,787 -37,813
3D body: height 393.7, standoff 0, extent 37,787 63,813
3D body: height 393.7, standoff 0, extent 37,687 63,713
3D body: height 393.7, standoff 0, extent -63,687 -37,713
3D body: height 393.7, standoff 0, extent -63,487 -37,513
3D body: height 393.7, standoff 0, extent 37,487 63,513
3D body: height 393.7, standoff 0, extent 37,587 63,613
3D body: height 393.7, standoff 0, extent -63,587 -37,613
3D body: height 393.7, standoff 0, extent -63,287 -37,313
3D body: height 393.7, standoff 0, extent 37,287 63,313
3D body: height 393.7, standoff 0, extent 37,387 63,413
3D body: height 393.7, standoff 0, extent -63,387 -37,413
3D body: height 393.7, standoff 0, extent -63,87 -37,113
3D body: height 393.7, standoff 0, extent 37,87 63,113
3D body: height 393.7, standoff 0, extent 37,187 63,213
3D body: height 393.7, standoff 0, extent -63,187 -37,213
3D body: height 393.7, standoff 0, extent -63,-113 -37,-87
3D body: height 393.7, standoff 0, extent 37,-113 63,-87
3D body: height 393.7, standoff 0, extent 37,-13 63,13
3D body: height 393.7, standoff 0, extent -63,-13 -37,13
3D body: height 393.7, standoff 0, extent -63,-313 -37,-287
3D body: height 393.7, standoff 0, extent 37,-313 63,-287
3D body: height 393.7, standoff 0, extent 37,-213 63,-187
3D body: height 393.7, standoff 0, extent -63,-213 -37,-187
3D body: height 393.7, standoff 0, extent -63,-513 -37,-487
3D body: height 393.7, standoff 0, extent 37,-513 63,-487
3D body: height 393.7, standoff 0, extent 37,-413 63,-387
3D body: height 393.7, standoff 0, extent -63,-413 -37,-387
3D body: height 393.7, standoff 0, extent -63,-713 -37,-687
3D body: height 393.7, standoff 0, extent 37,-713 63,-687
3D body: height 393.7, standoff 0, extent 37,-613 63,-587
3D body: height 393.7, standoff 0, extent -63,-613 -37,-587
3D body: height 393.7, standoff 0, extent 37,-813 63,-787
3D body: height 393.7, standoff 0, extent -63,-813 -37,-787

## PINHDR2X20 [mil] "Pin header 2x20 pin R2.54mm"
height 433.07
pads (40):
  rrect50% 65x65 hole 35.43 paste-50: 1(0,0)
  round 65 hole 35.43 paste-50: 2(100,0) 3(0,-100) 4(100,-100) 5(0,-200) 6(100,-200) 7(0,-300) 8(100,-300) 9(0,-400) 10(100,-400) 11(0,-500) 12(100,-500) 13(0,-600) 14(100,-600) 15(0,-700) 16(100,-700) 17(0,-800) 18(100,-800) 19(0,-900) 20(100,-900) 21(0,-1000) 22(100,-1000) 23(0,-1100) 24(100,-1100) 25(0,-1200) 26(100,-1200) 27(0,-1300) 28(100,-1300) 29(0,-1400) 30(100,-1400) 31(0,-1500) 32(100,-1500) 33(0,-1600) 34(100,-1600) 35(0,-1700) 36(100,-1700) 37(0,-1800) 38(100,-1800) 39(0,-1900) 40(100,-1900)
Top Overlay:
  circle w5.91: c-70,0 r6
  lines w5.91: -50,-1950 -50,50 150,50 150,-1950 -50,-1950
Mechanical 13:
  drawing of 165 lines, arcs and shapes, not listed
3D body: height 314.96, standoff -125.98, extent -13,-13 13,13
3D body: height 314.96, standoff -125.98, extent 87,-13 113,13
3D body: height 100, standoff 0, extent -50,-1950 150,50
3D body: height 314.96, standoff -125.98, extent 87,-113 113,-87
3D body: height 314.96, standoff -125.98, extent -13,-113 13,-87
3D body: height 314.96, standoff -125.98, extent 87,-213 113,-187
3D body: height 314.96, standoff -125.98, extent -13,-213 13,-187
3D body: height 314.96, standoff -125.98, extent 87,-313 113,-287
3D body: height 314.96, standoff -125.98, extent -13,-313 13,-287
3D body: height 314.96, standoff -125.98, extent 87,-413 113,-387
3D body: height 314.96, standoff -125.98, extent -13,-413 13,-387
3D body: height 314.96, standoff -125.98, extent 87,-513 113,-487
3D body: height 314.96, standoff -125.98, extent -13,-513 13,-487
3D body: height 314.96, standoff -125.98, extent 87,-613 113,-587
3D body: height 314.96, standoff -125.98, extent -13,-613 13,-587
3D body: height 314.96, standoff -125.98, extent 87,-713 113,-687
3D body: height 314.96, standoff -125.98, extent -13,-713 13,-687
3D body: height 314.96, standoff -125.98, extent 87,-813 113,-787
3D body: height 314.96, standoff -125.98, extent -13,-813 13,-787
3D body: height 314.96, standoff -125.98, extent 87,-913 113,-887
3D body: height 314.96, standoff -125.98, extent -13,-913 13,-887
3D body: height 314.96, standoff -125.98, extent 87,-1013 113,-987
3D body: height 314.96, standoff -125.98, extent -13,-1013 13,-987
3D body: height 314.96, standoff -125.98, extent 87,-1113 113,-1087
3D body: height 314.96, standoff -125.98, extent -13,-1113 13,-1087
3D body: height 314.96, standoff -125.98, extent 87,-1213 113,-1187
3D body: height 314.96, standoff -125.98, extent -13,-1213 13,-1187
3D body: height 314.96, standoff -125.98, extent 87,-1313 113,-1287
3D body: height 314.96, standoff -125.98, extent -13,-1313 13,-1287
3D body: height 314.96, standoff -125.98, extent 87,-1413 113,-1387
3D body: height 314.96, standoff -125.98, extent -13,-1413 13,-1387
3D body: height 314.96, standoff -125.98, extent 87,-1513 113,-1487
3D body: height 314.96, standoff -125.98, extent -13,-1513 13,-1487
3D body: height 314.96, standoff -125.98, extent 87,-1613 113,-1587
3D body: height 314.96, standoff -125.98, extent -13,-1613 13,-1587
3D body: height 314.96, standoff -125.98, extent 87,-1713 113,-1687
3D body: height 314.96, standoff -125.98, extent -13,-1713 13,-1687
3D body: height 314.96, standoff -125.98, extent 87,-1813 113,-1787
3D body: height 314.96, standoff -125.98, extent -13,-1813 13,-1787
3D body: height 314.96, standoff -125.98, extent -13,-1913 13,-1887
3D body: height 314.96, standoff -125.98, extent 87,-1913 113,-1887

## PINHDR2X20H [mm] "Pin header 2x20 pin R2.54mm Horizontal"
height 8.16
pads (40):
  rrect50% 1.8x1.8 hole 1 paste-1.27: 1(0,0)
  round 1.8 hole 1 paste-1.27: 2(-2.54,0) 3(0,-2.54) 4(-2.54,-2.54) 5(0,-5.08) 6(-2.54,-5.08) 7(0,-7.62) 8(-2.54,-7.62) 9(0,-10.16) 10(-2.54,-10.16) 11(0,-12.7) 12(-2.54,-12.7) 13(0,-15.24) 14(-2.54,-15.24) 15(0,-17.78) 16(-2.54,-17.78) 17(0,-20.32) 18(-2.54,-20.32) 19(0,-22.86) 20(-2.54,-22.86) 21(0,-25.4) 22(-2.54,-25.4) 23(0,-27.94) 24(-2.54,-27.94) 25(0,-30.48) 26(-2.54,-30.48) 27(0,-33.02) 28(-2.54,-33.02) 29(0,-35.56) 30(-2.54,-35.56) 31(0,-38.1) 32(-2.54,-38.1) 33(0,-40.64) 34(-2.54,-40.64) 35(0,-43.18) 36(-2.54,-43.18) 37(0,-45.72) 38(-2.54,-45.72) 39(0,-48.26) 40(-2.54,-48.26)
Top Overlay:
  circle w0.15: c1.626,2.032 r0.152
  lines w0.15: -3.81,-49.53 1.27,-49.53 1.27,1.27 -3.81,1.27 -3.81,-49.53
Mechanical 13:
  circle w0.254: c0.864,2.032 r0.152
  lines w0.1: -7.37,-48.59 -13.462,-48.59 -13.462,-47.93 -7.37,-47.93 ; -7.37,-46.05 -13.462,-46.05 -13.462,-45.39 -7.37,-45.39 ; -7.37,-43.51 -13.462,-43.51 -13.462,-42.85 -7.37,-42.85 ; -7.37,-40.97 -13.462,-40.97 -13.462,-40.31 -7.37,-40.31 ; -7.37,-38.43 -13.462,-38.43 -13.462,-37.77 -7.37,-37.77 ; -7.37,-35.89 -13.462,-35.89 -13.462,-35.23 -7.37,-35.23 ; -7.37,-33.35 -13.462,-33.35 -13.462,-32.69 -7.37,-32.69 ; -7.37,-30.81 -13.462,-30.81 -13.462,-30.15 -7.37,-30.15 ; -7.37,-28.27 -13.462,-28.27 -13.462,-27.61 -7.37,-27.61 ; -7.37,-25.73 -13.462,-25.73 -13.462,-25.07 -7.37,-25.07 ; -7.37,-23.19 -13.462,-23.19 -13.462,-22.53 -7.37,-22.53 ; -7.37,-20.65 -13.462,-20.65 -13.462,-19.99 -7.37,-19.99 ; -7.37,-18.11 -13.462,-18.11 -13.462,-17.45 -7.37,-17.45 ; -7.37,-15.57 -13.462,-15.57 -13.462,-14.91 -7.37,-14.91 ; -7.37,-13.03 -13.462,-13.03 -13.462,-12.37 -7.37,-12.37 ; -7.37,-10.49 -13.462,-10.49 -13.462,-9.83 -7.37,-9.83 ; -7.37,-7.95 -13.462,-7.95 -13.462,-7.29 -7.37,-7.29 ; -7.37,-5.41 -13.462,-5.41 -13.462,-4.75 -7.37,-4.75 ; -7.37,-2.87 -13.462,-2.87 -13.462,-2.21 -7.37,-2.21 ; -7.37,-0.33 -13.462,-0.33 -13.462,0.33 -7.37,0.33 ; -5.08,-48.59 0.33,-48.59 0.33,-47.93 -5.08,-47.93 ; -5.08,-46.05 0.33,-46.05 0.33,-45.39 -5.08,-45.39 ; -5.08,-43.51 0.33,-43.51 0.33,-42.85 -5.08,-42.85 ; -5.08,-40.97 0.33,-40.97 0.33,-40.31 -5.08,-40.31 ; -5.08,-38.43 0.33,-38.43 0.33,-37.77 -5.08,-37.77 ; -5.08,-35.89 0.33,-35.89 0.33,-35.23 -5.08,-35.23 ; -5.08,-33.35 0.33,-33.35 0.33,-32.69 -5.08,-32.69 ; -5.08,-30.81 0.33,-30.81 0.33,-30.15 -5.08,-30.15 ; -5.08,-28.27 0.33,-28.27 0.33,-27.61 -5.08,-27.61 ; -5.08,-25.73 0.33,-25.73 0.33,-25.07 -5.08,-25.07 ; -5.08,-23.19 0.33,-23.19 0.33,-22.53 -5.08,-22.53 ; -5.08,-20.65 0.33,-20.65 0.33,-19.99 -5.08,-19.99 ; -5.08,-18.11 0.33,-18.11 0.33,-17.45 -5.08,-17.45 ; -5.08,-15.57 0.33,-15.57 0.33,-14.91 -5.08,-14.91 ; -5.08,-13.03 0.33,-13.03 0.33,-12.37 -5.08,-12.37 ; -5.08,-10.49 0.33,-10.49 0.33,-9.83 -5.08,-9.83 ; -5.08,-7.95 0.33,-7.95 0.33,-7.29 -5.08,-7.29 ; -5.08,-5.41 0.33,-5.41 0.33,-4.75 -5.08,-4.75 ; -5.08,-2.87 0.33,-2.87 0.33,-2.21 -5.08,-2.21 ; -5.08,-0.33 0.33,-0.33 0.33,0.33 -5.08,0.33
  lines w0.102: -7.37,-49.53 -7.37,1.27 -5.08,1.27 -5.08,-49.53 -7.37,-49.53
3D body: height 3.75, standoff 0, extent -0.33,-0.33 0.33,0.33
3D body: height 3.75, standoff 0, extent -0.33,-2.87 0.33,-2.21
3D body: height 3.75, standoff 0, extent -0.33,-5.41 0.33,-4.75
3D body: height 3.75, standoff 0, extent -0.33,-7.95 0.33,-7.29
3D body: height 3.75, standoff 0, extent -0.33,-10.49 0.33,-9.83
3D body: height 3.75, standoff 0, extent -0.33,-13.03 0.33,-12.37
3D body: height 3.75, standoff 0, extent -0.33,-15.57 0.33,-14.91
3D body: height 3.75, standoff 0, extent -0.33,-18.11 0.33,-17.45
3D body: height 3.75, standoff 0, extent -0.33,-20.65 0.33,-19.99
3D body: height 3.75, standoff 0, extent -0.33,-23.19 0.33,-22.53
3D body: height 3.75, standoff 0, extent -0.33,-25.73 0.33,-25.07
3D body: height 3.75, standoff 0, extent -0.33,-28.27 0.33,-27.61
3D body: height 3.75, standoff 0, extent -0.33,-30.81 0.33,-30.15
3D body: height 3.75, standoff 0, extent -0.33,-33.35 0.33,-32.69
3D body: height 3.75, standoff 0, extent -0.33,-35.89 0.33,-35.23
3D body: height 3.75, standoff 0, extent -0.33,-38.43 0.33,-37.77
3D body: height 3.75, standoff 0, extent -0.33,-40.97 0.33,-40.31
3D body: height 3.75, standoff 0, extent -0.33,-43.51 0.33,-42.85
3D body: height 3.75, standoff 0, extent -0.33,-46.05 0.33,-45.39
3D body: height 3.75, standoff 0, extent -0.33,-48.59 0.33,-47.93
3D body: height 1.25, standoff 0, extent -2.87,-0.33 -2.21,0.33
3D body: height 1.25, standoff 0, extent -2.87,-2.87 -2.21,-2.21
3D body: height 1.25, standoff 0, extent -2.87,-5.41 -2.21,-4.75
3D body: height 1.25, standoff 0, extent -2.87,-7.95 -2.21,-7.29
3D body: height 1.25, standoff 0, extent -2.87,-10.49 -2.21,-9.83
3D body: height 1.25, standoff 0, extent -2.87,-13.03 -2.21,-12.37
3D body: height 1.25, standoff 0, extent -2.87,-15.57 -2.21,-14.91
3D body: height 1.25, standoff 0, extent -2.87,-18.11 -2.21,-17.45
3D body: height 1.25, standoff 0, extent -2.87,-20.65 -2.21,-19.99
3D body: height 1.25, standoff 0, extent -2.87,-23.19 -2.21,-22.53
3D body: height 1.25, standoff 0, extent -2.87,-25.73 -2.21,-25.07
3D body: height 1.25, standoff 0, extent -2.87,-28.27 -2.21,-27.61
3D body: height 1.25, standoff 0, extent -2.87,-30.81 -2.21,-30.15
3D body: height 1.25, standoff 0, extent -2.87,-33.35 -2.21,-32.69
3D body: height 1.25, standoff 0, extent -2.87,-35.89 -2.21,-35.23
3D body: height 1.25, standoff 0, extent -2.87,-38.43 -2.21,-37.77
3D body: height 1.25, standoff 0, extent -2.87,-40.97 -2.21,-40.31
3D body: height 1.25, standoff 0, extent -2.87,-43.51 -2.21,-42.85
3D body: height 1.25, standoff 0, extent -2.87,-46.05 -2.21,-45.39
3D body: height 1.25, standoff 0, extent -2.87,-48.59 -2.21,-47.93
3D body: height 5, standoff 0, extent -7.37,-49.53 -5.08,1.27
3D body: height 1.9, standoff 1.25, extent -5.08,-48.59 -2.21,-47.93
3D body: height 1.9, standoff 1.25, extent -5.08,-46.05 -2.21,-45.39
3D body: height 1.9, standoff 1.25, extent -5.08,-43.51 -2.21,-42.85
3D body: height 1.9, standoff 1.25, extent -5.08,-40.97 -2.21,-40.31
3D body: height 1.9, standoff 1.25, extent -5.08,-38.43 -2.21,-37.77
3D body: height 1.9, standoff 1.25, extent -5.08,-35.89 -2.21,-35.23
3D body: height 1.9, standoff 1.25, extent -5.08,-33.35 -2.21,-32.69
3D body: height 1.9, standoff 1.25, extent -5.08,-30.81 -2.21,-30.15
3D body: height 1.9, standoff 1.25, extent -5.08,-28.27 -2.21,-27.61
3D body: height 1.9, standoff 1.25, extent -5.08,-25.73 -2.21,-25.07
3D body: height 1.9, standoff 1.25, extent -5.08,-23.19 -2.21,-22.53
3D body: height 1.9, standoff 1.25, extent -5.08,-20.65 -2.21,-19.99
3D body: height 1.9, standoff 1.25, extent -5.08,-18.11 -2.21,-17.45
3D body: height 1.9, standoff 1.25, extent -5.08,-15.57 -2.21,-14.91
3D body: height 1.9, standoff 1.25, extent -5.08,-13.03 -2.21,-12.37
3D body: height 1.9, standoff 1.25, extent -5.08,-10.49 -2.21,-9.83
3D body: height 1.9, standoff 1.25, extent -5.08,-7.95 -2.21,-7.29
3D body: height 1.9, standoff 1.25, extent -5.08,-5.41 -2.21,-4.75
3D body: height 1.9, standoff 1.25, extent -5.08,-2.87 -2.21,-2.21
3D body: height 1.9, standoff 1.25, extent -5.08,-0.33 -2.21,0.33
3D body: height 4.43, standoff 3.75, extent -5.08,-48.59 0.33,-47.93
3D body: height 4.43, standoff 3.75, extent -5.08,-46.05 0.33,-45.39
3D body: height 4.43, standoff 3.75, extent -5.08,-43.51 0.33,-42.85
3D body: height 4.43, standoff 3.75, extent -5.08,-40.97 0.33,-40.31
3D body: height 4.43, standoff 3.75, extent -5.08,-38.43 0.33,-37.77
3D body: height 4.43, standoff 3.75, extent -5.08,-35.89 0.33,-35.23
3D body: height 4.43, standoff 3.75, extent -5.08,-33.35 0.33,-32.69
3D body: height 4.43, standoff 3.75, extent -5.08,-30.81 0.33,-30.15
3D body: height 4.43, standoff 3.75, extent -5.08,-28.27 0.33,-27.61
3D body: height 4.43, standoff 3.75, extent -5.08,-25.73 0.33,-25.07
3D body: height 4.43, standoff 3.75, extent -5.08,-23.19 0.33,-22.53
3D body: height 4.43, standoff 3.75, extent -5.08,-20.65 0.33,-19.99
3D body: height 4.43, standoff 3.75, extent -5.08,-18.11 0.33,-17.45
3D body: height 4.43, standoff 3.75, extent -5.08,-15.57 0.33,-14.91
3D body: height 4.43, standoff 3.75, extent -5.08,-13.03 0.33,-12.37
3D body: height 4.43, standoff 3.75, extent -5.08,-10.49 0.33,-9.83
3D body: height 4.43, standoff 3.75, extent -5.08,-7.95 0.33,-7.29
3D body: height 4.43, standoff 3.75, extent -5.08,-5.41 0.33,-4.75
3D body: height 4.43, standoff 3.75, extent -5.08,-2.87 0.33,-2.21
3D body: height 4.43, standoff 3.75, extent -5.08,-0.33 0.33,0.33
3D body: height 4.43, standoff 3.75, extent -13.462,-48.59 -7.37,-47.93
3D body: height 4.43, standoff 3.75, extent -13.462,-46.05 -7.37,-45.39
3D body: height 4.43, standoff 3.75, extent -13.462,-43.51 -7.37,-42.85
3D body: height 4.43, standoff 3.75, extent -13.462,-40.97 -7.37,-40.31
3D body: height 4.43, standoff 3.75, extent -13.462,-38.43 -7.37,-37.77
3D body: height 4.43, standoff 3.75, extent -13.462,-35.89 -7.37,-35.23
3D body: height 4.43, standoff 3.75, extent -13.462,-33.35 -7.37,-32.69
3D body: height 4.43, standoff 3.75, extent -13.462,-30.81 -7.37,-30.15
3D body: height 4.43, standoff 3.75, extent -13.462,-28.27 -7.37,-27.61
3D body: height 4.43, standoff 3.75, extent -13.462,-25.73 -7.37,-25.07
3D body: height 4.43, standoff 3.75, extent -13.462,-23.19 -7.37,-22.53
3D body: height 4.43, standoff 3.75, extent -13.462,-20.65 -7.37,-19.99
3D body: height 4.43, standoff 3.75, extent -13.462,-18.11 -7.37,-17.45
3D body: height 4.43, standoff 3.75, extent -13.462,-15.57 -7.37,-14.91
3D body: height 4.43, standoff 3.75, extent -13.462,-13.03 -7.37,-12.37
3D body: height 4.43, standoff 3.75, extent -13.462,-10.49 -7.37,-9.83
3D body: height 4.43, standoff 3.75, extent -13.462,-7.95 -7.37,-7.29
3D body: height 4.43, standoff 3.75, extent -13.462,-5.41 -7.37,-4.75
3D body: height 4.43, standoff 3.75, extent -13.462,-2.87 -7.37,-2.21
3D body: height 4.43, standoff 3.75, extent -13.462,-0.33 -7.37,0.33
3D body: height 1.9, standoff 1.25, extent -13.462,-48.59 -7.37,-47.93
3D body: height 1.9, standoff 1.25, extent -13.462,-46.05 -7.37,-45.39
3D body: height 1.9, standoff 1.25, extent -13.462,-43.51 -7.37,-42.85
3D body: height 1.9, standoff 1.25, extent -13.462,-40.97 -7.37,-40.31
3D body: height 1.9, standoff 1.25, extent -13.462,-38.43 -7.37,-37.77
3D body: height 1.9, standoff 1.25, extent -13.462,-35.89 -7.37,-35.23
3D body: height 1.9, standoff 1.25, extent -13.462,-33.35 -7.37,-32.69
3D body: height 1.9, standoff 1.25, extent -13.462,-30.81 -7.37,-30.15
3D body: height 1.9, standoff 1.25, extent -13.462,-28.27 -7.37,-27.61
3D body: height 1.9, standoff 1.25, extent -13.462,-25.73 -7.37,-25.07
3D body: height 1.9, standoff 1.25, extent -13.462,-23.19 -7.37,-22.53
3D body: height 1.9, standoff 1.25, extent -13.462,-20.65 -7.37,-19.99
3D body: height 1.9, standoff 1.25, extent -13.462,-18.11 -7.37,-17.45
3D body: height 1.9, standoff 1.25, extent -13.462,-15.57 -7.37,-14.91
3D body: height 1.9, standoff 1.25, extent -13.462,-13.03 -7.37,-12.37
3D body: height 1.9, standoff 1.25, extent -13.462,-10.49 -7.37,-9.83
3D body: height 1.9, standoff 1.25, extent -13.462,-7.95 -7.37,-7.29
3D body: height 1.9, standoff 1.25, extent -13.462,-5.41 -7.37,-4.75
3D body: height 1.9, standoff 1.25, extent -13.462,-2.87 -7.37,-2.21
3D body: height 1.9, standoff 1.25, extent -13.462,-0.33 -7.37,0.33

## PINHDR2X23V [mil] "Pin header 2x23 pin R2.54mm"
height 433.07
pads (46):
  rrect50% 65x65 hole 35.43 paste-50: 1(0,0)
  round 65 hole 35.43 paste-50: 2(100,0) 3(0,-100) 4(100,-100) 5(0,-200) 6(100,-200) 7(0,-300) 8(100,-300) 9(0,-400) 10(100,-400) 11(0,-500) 12(100,-500) 13(0,-600) 14(100,-600) 15(0,-700) 16(100,-700) 17(0,-800) 18(100,-800) 19(0,-900) 20(100,-900) 21(0,-1000) 22(100,-1000) 23(0,-1100) 24(100,-1100) 25(0,-1200) 26(100,-1200) 27(0,-1300) 28(100,-1300) 29(0,-1400) 30(100,-1400) 31(0,-1500) 32(100,-1500) 33(0,-1600) 34(100,-1600) 35(0,-1700) 36(100,-1700) 37(0,-1800) 38(100,-1800) 39(0,-1900) 40(100,-1900) 41(0,-2000) 42(100,-2000) 43(0,-2100) 44(100,-2100) 45(0,-2200) 46(100,-2200)
Top Overlay:
  circle w5.91: c-70,0 r6
  lines w5.91: -50,-2250 -50,50 150,50 150,-2250 -50,-2250
Mechanical 13:
  drawing of 189 lines, arcs and shapes, not listed
3D body: height 314.96, standoff -125.98, extent 87,-1913 113,-1887
3D body: height 314.96, standoff -125.98, extent -13,-1913 13,-1887
3D body: height 314.96, standoff -125.98, extent -13,-1813 13,-1787
3D body: height 314.96, standoff -125.98, extent 87,-1813 113,-1787
3D body: height 314.96, standoff -125.98, extent -13,-1713 13,-1687
3D body: height 314.96, standoff -125.98, extent 87,-1713 113,-1687
3D body: height 314.96, standoff -125.98, extent -13,-1613 13,-1587
3D body: height 314.96, standoff -125.98, extent 87,-1613 113,-1587
3D body: height 314.96, standoff -125.98, extent -13,-1513 13,-1487
3D body: height 314.96, standoff -125.98, extent 87,-1513 113,-1487
3D body: height 314.96, standoff -125.98, extent -13,-1413 13,-1387
3D body: height 314.96, standoff -125.98, extent 87,-1413 113,-1387
3D body: height 314.96, standoff -125.98, extent -13,-1313 13,-1287
3D body: height 314.96, standoff -125.98, extent 87,-1313 113,-1287
3D body: height 314.96, standoff -125.98, extent -13,-1213 13,-1187
3D body: height 314.96, standoff -125.98, extent 87,-1213 113,-1187
3D body: height 314.96, standoff -125.98, extent -13,-1113 13,-1087
3D body: height 314.96, standoff -125.98, extent 87,-1113 113,-1087
3D body: height 314.96, standoff -125.98, extent -13,-1013 13,-987
3D body: height 314.96, standoff -125.98, extent 87,-1013 113,-987
3D body: height 314.96, standoff -125.98, extent -13,-913 13,-887
3D body: height 314.96, standoff -125.98, extent 87,-913 113,-887
3D body: height 314.96, standoff -125.98, extent -13,-813 13,-787
3D body: height 314.96, standoff -125.98, extent 87,-813 113,-787
3D body: height 314.96, standoff -125.98, extent -13,-713 13,-687
3D body: height 314.96, standoff -125.98, extent 87,-713 113,-687
3D body: height 314.96, standoff -125.98, extent -13,-613 13,-587
3D body: height 314.96, standoff -125.98, extent 87,-613 113,-587
3D body: height 314.96, standoff -125.98, extent -13,-513 13,-487
3D body: height 314.96, standoff -125.98, extent 87,-513 113,-487
3D body: height 314.96, standoff -125.98, extent -13,-413 13,-387
3D body: height 314.96, standoff -125.98, extent 87,-413 113,-387
3D body: height 314.96, standoff -125.98, extent -13,-313 13,-287
3D body: height 314.96, standoff -125.98, extent 87,-313 113,-287
3D body: height 314.96, standoff -125.98, extent -13,-213 13,-187
3D body: height 314.96, standoff -125.98, extent 87,-213 113,-187
3D body: height 314.96, standoff -125.98, extent -13,-113 13,-87
3D body: height 314.96, standoff -125.98, extent 87,-113 113,-87
3D body: height 100, standoff 0, extent -50,-2250 150,50
3D body: height 314.96, standoff -125.98, extent 87,-13 113,13
3D body: height 314.96, standoff -125.98, extent -13,-13 13,13
3D body: height 314.96, standoff -125.98, extent -13,-2013 13,-1987
3D body: height 314.96, standoff -125.98, extent 87,-2013 113,-1987
3D body: height 314.96, standoff -125.98, extent -13,-2113 13,-2087
3D body: height 314.96, standoff -125.98, extent 87,-2113 113,-2087
3D body: height 314.96, standoff -125.98, extent -13,-2213 13,-2187
3D body: height 314.96, standoff -125.98, extent 87,-2213 113,-2187